# Altium footprint library ICs And Semiconductors SMD.PcbLib: 602 footprints (part 12 of 38)
Each footprint in its own frame and in the unit in brackets; x right, y up, seen from the top. Pads: shape width x height; smd on the part's side, far side on the other; paste and mask are expansions set on the pad; w line width, h text height; cw(c..) or ccw(c..) is an arc to the next point about the centre after c.
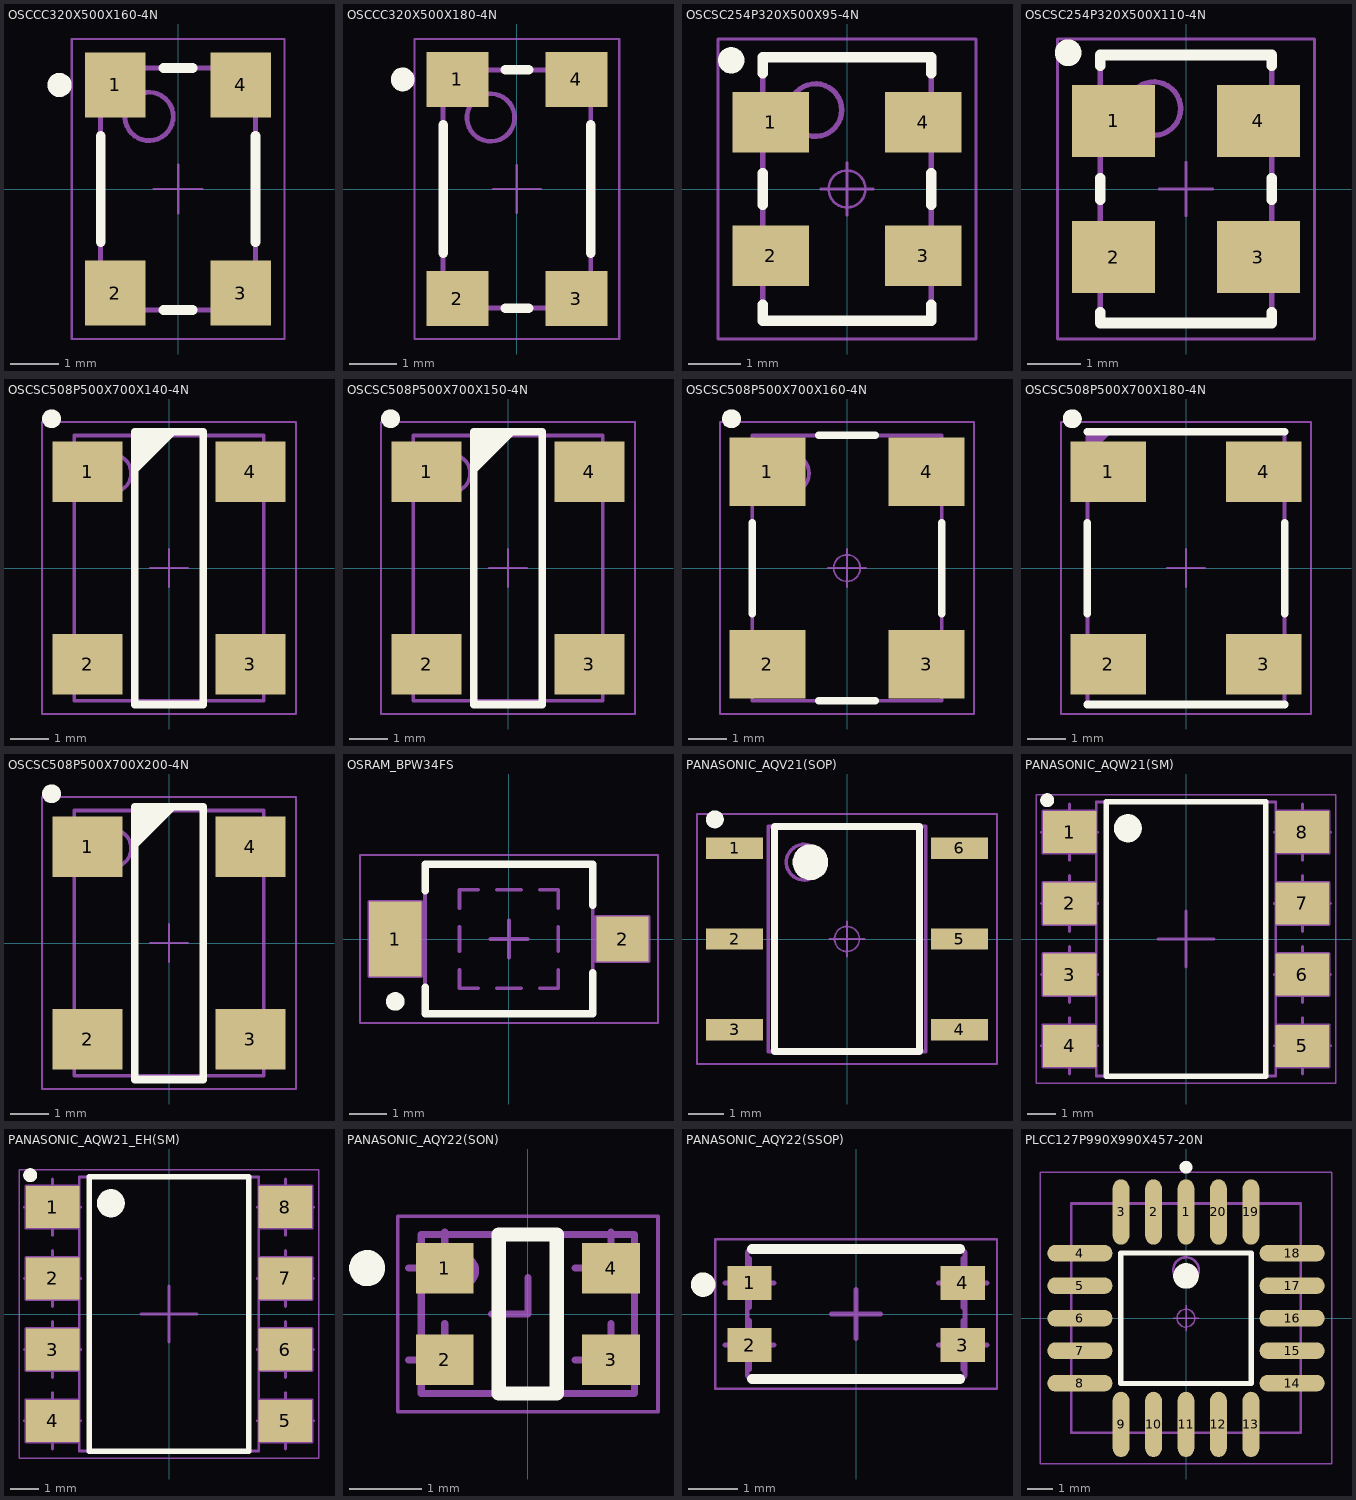
[diagram p11: the footprints below, top view; thin cyan lines are the x and y axes]

## OSCCC320X500X160-4N [mm] "SMD Oscillator, Corner Convave, 4 pins, 5x3.2mm"
height 1.6
pads (4):
  rect 1.25x1.35 smd: 1(-1.3,2.15) 2(-1.3,-2.15) 3(1.3,-2.15) 4(1.3,2.15)
Top Overlay:
  circle w0.25: c-2.45,2.15 r0.125
  lines w0.2: -1.6,-1.1 -1.6,1.1 ; -0.3,-2.5 0.3,-2.5 ; -0.3,2.5 0.3,2.5 ; 1.6,-1.1 1.6,1.1
Mechanical 14:
  circle w0.1: c-0.6,1.5 r0.5
  lines w0.1: -1.6,-2.5 1.6,-2.5 1.6,2.5 -1.6,2.5 -1.6,-2.5
Mechanical 15:
  lines w0.05: -0.5,0 0.5,0 ; 0,-0.5 0,0.5 ; -2.2,-3.1 2.2,-3.1 2.2,3.1 -2.2,3.1 -2.2,-3.1
3D body "OSCCC320X500X160-4N.stp": height 1.6, standoff 0, extent -1.675,-2.575 1.675,2.575

## OSCCC320X500X180-4N [mm] "SMD Oscillator, Corner Convave, 4 pins, 5x3mm"
height 1.8
pads (4):
  rect 1.3x1.15 smd: 1(-1.25,2.3) 2(-1.25,-2.3) 3(1.25,-2.3) 4(1.25,2.3)
Top Overlay:
  circle w0.25: c-2.4,2.3 r0.125
  lines w0.2: -1.55,-1.35 -1.55,1.35 ; -0.25,-2.5 0.25,-2.5 ; -0.25,2.5 0.25,2.5 ; 1.55,-1.35 1.55,1.35
Mechanical 14:
  circle w0.1: c-0.55,1.5 r0.5
  lines w0.1: -1.55,-2.5 1.55,-2.5 1.55,2.5 -1.55,2.5 -1.55,-2.5
Mechanical 15:
  lines w0.05: -0.5,0 0.5,0 ; 0,-0.5 0,0.5 ; -2.15,-3.15 2.15,-3.15 2.15,3.15 -2.15,3.15 -2.15,-3.15
3D body "OSCCC320X500X180-4N.stp": height 1.8, standoff 0, extent -1.7,-2.6 1.7,2.6

## OSCSC254P320X500X95-4N [mm] "Oscillator, side concave; 2.54mm pitch; 4 pin, 3.20mm L X 5.00mm W X 1.10mm H, IPC Medium Density"
height 0.95
pads (4):
  rect 1.45x1.15 smd: 1(-1.45,1.27) 2(-1.45,-1.27) 3(1.45,-1.27) 4(1.45,1.27)
Top Overlay:
  circle w0.25: c-2.2,2.445 r0.125
  lines w0.2: -1.6,-2.2 -1.6,-2.5 1.6,-2.5 1.6,-2.2 ; -1.6,-0.3 -1.6,0.3 ; -1.6,2.2 -1.6,2.5 1.6,2.5 1.6,2.2 ; 1.6,-0.3 1.6,0.3
Mechanical 14:
  circle w0.1: c-0.6,1.5 r0.5
  lines w0.1: -1.6,-2.5 -1.6,2.5 1.6,2.5 1.6,-2.5 -1.6,-2.5
Mechanical 15:
  circle w0.05: c0,0 r0.35
  lines w0.05: -0.5,0 0.5,0 ; 0,-0.5 0,0.5 ; -2.45,-2.85 -2.45,2.85 2.45,2.85 2.45,-2.85 -2.45,-2.85
3D body "OSCSC254P320X500X110-4N.stp": height 1, standoff 0, extent -1.7,-2.6 1.7,2.6

## OSCSC254P320X500X110-4N [mm] "Oscillator, side concave; 2.54mm pitch; 4 pin, 3.20mm L X 5.00mm W X 1.10mm H, IPC Medium Density"
height 1.1
pads (4):
  rect 1.55x1.35 smd: 1(-1.35,1.27) 2(-1.35,-1.27) 3(1.35,-1.27) 4(1.35,1.27)
Top Overlay:
  circle w0.25: c-2.2,2.545 r0.125
  lines w0.2: -1.6,-2.3 -1.6,-2.5 1.6,-2.5 1.6,-2.3 ; -1.6,-0.2 -1.6,0.2 ; -1.6,2.3 -1.6,2.5 1.6,2.5 1.6,2.3 ; 1.6,-0.2 1.6,0.2
Mechanical 14:
  circle w0.1: c-0.6,1.5 r0.5
  lines w0.1: -1.6,-2.5 -1.6,2.5 1.6,2.5 1.6,-2.5 -1.6,-2.5
Mechanical 15:
  lines w0.05: -0.5,0 0.5,0 ; 0,-0.5 0,0.5 ; -2.4,-2.8 -2.4,2.8 2.4,2.8 2.4,-2.8 -2.4,-2.8
3D body "OSCSC254P320X500X110-4N.stp": height 1, standoff 0, extent -1.7,-2.6 1.7,2.6

## OSCSC508P500X700X140-4N [mm] "Oscillator,side concave; 5.08mm pitch; 4 pin,5.00mm L X 7.00mm W X 1.40mm H, IPC Medium Density"
height 1.4
pads (4):
  rect 1.85x1.6 smd: 1(-2.15,2.54) 2(-2.15,-2.54) 3(2.15,-2.54) 4(2.15,2.54)
Top Overlay:
  circle w0.25: c-3.1,3.94 r0.125
  lines w0.2: -0.9,2.6 0.1,3.6 ; -0.9,2.8 -0.1,3.6 ; -0.9,3 -0.3,3.6 ; -0.9,3.2 -0.5,3.6 ; -0.9,3.4 -0.7,3.6 ; -0.9,-3.6 0.9,-3.6 0.9,3.6 -0.9,3.6 -0.9,-3.6
Mechanical 14:
  circle w0.1: c-1.5,2.5 r0.5
  lines w0.1: -2.5,-3.5 2.5,-3.5 2.5,3.5 -2.5,3.5 -2.5,-3.5
Mechanical 15:
  lines w0.05: -0.5,0 0.5,0 ; 0,-0.5 0,0.5 ; -3.35,-3.85 3.35,-3.85 3.35,3.85 -3.35,3.85 -3.35,-3.85
3D body "OSCSC508P500X700X140-4N.stp": height 1.4, standoff 0, extent -2.6,-3.6 2.6,3.6

## OSCSC508P500X700X150-4N [mm] "CFPS-72-73 Case, SMD Oscillator, side convave, 4 pins, 5.00x7.00mm"
height 1.5
pads (4):
  rect 1.85x1.6 smd: 1(-2.15,2.54) 2(-2.15,-2.54) 3(2.15,-2.54) 4(2.15,2.54)
Top Overlay:
  circle w0.25: c-3.1,3.94 r0.125
  lines w0.2: -0.9,2.6 0.1,3.6 ; -0.9,2.8 -0.1,3.6 ; -0.9,3 -0.3,3.6 ; -0.9,3.2 -0.5,3.6 ; -0.9,3.4 -0.7,3.6 ; -0.9,-3.6 -0.9,3.6 0.9,3.6 0.9,-3.6 -0.9,-3.6
Mechanical 14:
  circle w0.1: c-1.5,2.5 r0.5
  lines w0.1: -2.5,-3.5 2.5,-3.5 2.5,3.5 -2.5,3.5 -2.5,-3.5
Mechanical 15:
  lines w0.05: -0.5,0 0.5,0 ; 0,-0.5 0,0.5 ; -3.35,-3.85 3.35,-3.85 3.35,3.85 -3.35,3.85 -3.35,-3.85
3D body "OSCSC508P500X700X150-4N.stp": height 1.5, standoff 0, extent -2.6,-3.6 2.6,3.6

## OSCSC508P500X700X160-4N [mm] "SMD Oscillator, side convave, 4 pins, 5.00x7.00mm"
height 1.6
pads (4):
  rect 2x1.8 smd: 1(-2.1,2.54) 2(-2.1,-2.54) 3(2.1,-2.54) 4(2.1,2.54)
Top Overlay:
  circle w0.25: c-3.05,3.94 r0.125
  lines w0.2: -2.5,-1.2 -2.5,1.2 ; -0.75,-3.5 0.75,-3.5 ; -0.75,3.5 0.75,3.5 ; 2.5,-1.2 2.5,1.2
Mechanical 14:
  circle w0.1: c-1.5,2.5 r0.5
  lines w0.1: -2.5,-3.5 -2.5,3.5 2.5,3.5 2.5,-3.5 -2.5,-3.5
Mechanical 15:
  circle w0.05: c0,0 r0.35
  lines w0.05: -0.5,0 0.5,0 ; 0,-0.5 0,0.5 ; -3.35,-3.85 -3.35,3.85 3.35,3.85 3.35,-3.85 -3.35,-3.85
3D body "OSCSC508P500X700X160-4N.stp": height 1.6, standoff 0, extent -2.6,-3.6 2.6,3.6

## OSCSC508P500X700X180-4N [mm] "SMD Oscillator, side convave, 4 pins, 5.00x7.00mm"
height 1.8
pads (4):
  rect 2x1.6 smd: 1(-2.05,2.54) 2(-2.05,-2.54) 3(2.05,-2.54) 4(2.05,2.54)
Top Overlay:
  circle w0.25: c-3,3.94 r0.125
  lines w0.2: -2.6,-3.6 2.6,-3.6 ; -2.6,-1.2 -2.6,1.2 ; -2.6,3.6 2.6,3.6 ; 2.6,-1.2 2.6,1.2
Mechanical 14:
  lines w0.1: -2.6,3 -2,3.6 ; -2.6,3.1 -2.1,3.6 ; -2.6,3.2 -2.2,3.6 ; -2.6,3.3 -2.3,3.6 ; -2.6,3.4 -2.4,3.6 ; -2.6,3.5 -2.5,3.6 ; -2.6,-3.6 2.6,-3.6 2.6,3.6 -2.6,3.6 -2.6,-3.6
Mechanical 15:
  lines w0.05: -0.5,0 0.5,0 ; 0,-0.5 0,0.5 ; -3.3,-3.85 -3.3,3.85 3.3,3.85 3.3,-3.85 -3.3,-3.85
3D body "OSCSC508P500X700X180-4N.stp": height 1.8, standoff 0, extent -2.6,-3.6 2.6,3.6

## OSCSC508P500X700X200-4N [mm] "CFPT Case, SMD Oscillator, side convave, 4 pins, 5.00x7.00mm"
height 2
pads (4):
  rect 1.85x1.6 smd: 1(-2.15,2.54) 2(-2.15,-2.54) 3(2.15,-2.54) 4(2.15,2.54)
Top Overlay:
  circle w0.25: c-3.1,3.94 r0.125
  lines w0.2: -0.9,2.6 0.1,3.6 ; -0.9,2.8 -0.1,3.6 ; -0.9,3 -0.3,3.6 ; -0.9,3.2 -0.5,3.6 ; -0.9,3.4 -0.7,3.6 ; -0.9,-3.6 0.9,-3.6 0.9,3.6 -0.9,3.6 -0.9,-3.6
Mechanical 14:
  circle w0.1: c-1.5,2.5 r0.5
  lines w0.1: -2.5,-3.5 -2.5,3.5 2.5,3.5 2.5,-3.5 -2.5,-3.5
Mechanical 15:
  lines w0.05: -0.5,0 0.5,0 ; 0,-0.5 0,0.5 ; -3.35,-3.85 -3.35,3.85 3.35,3.85 3.35,-3.85 -3.35,-3.85
3D body "OSCSC508P500X700X200-4N.stp": height 2, standoff 0, extent -2.6,-3.6 2.6,3.6

## OSRAM_BPW34FS [mm] "SMT Silicon PIN Photodiode, Photosensitive Area 2.65 x 2.65 mm, with Daylight Filter"
height 1.2
pads (2):
  rect 1.4x2 smd: 1(-3.05,0)
  rect 1.4x1.2 smd: 2(3.05,0)
Top Overlay:
  circle w0.25: c-3.05,-1.675 r0.125
  lines w0.2: -2.25,-1.3 -2.25,-2 2.25,-2 2.25,-0.9 ; -2.25,1.3 -2.25,2 2.25,2 2.25,0.9
Mechanical 8:
  lines w0.1: -3.55,0 -3.05,0 ; -3.05,-0.5 -3.05,0 ; -3.05,0.5 -3.05,0 ; -2.55,0 -3.05,0 ; -0.5,0 0,0 ; 0,-0.5 0,0 ; 0,0.5 0,0 ; 0.5,0 0,0 ; 2.55,0 3.05,0 ; 3.05,-0.5 3.05,0 ; 3.05,0.5 3.05,0 ; 3.55,0 3.05,0 ; -3.75,-1 -3.75,1 -2.35,1 -2.35,-1 -3.75,-1 ; 2.35,-0.6 2.35,0.6 3.75,0.6 3.75,-0.6 2.35,-0.6
Mechanical 14:
  lines w0.1: -2.25,-0.85 -3.35,-0.85 -3.35,0.85 -2.25,0.85 ; -2.25,-0.45 -2.656,-0.45 -2.656,0.45 -2.25,0.45 ; -1.325,-0.825 -1.325,-1.325 -0.825,-1.325 ; -1.325,-0.325 -1.325,0.325 ; -1.325,0.825 -1.325,1.325 -0.825,1.325 ; -0.325,-1.325 0.325,-1.325 ; -0.325,1.325 0.325,1.325 ; 0.825,-1.325 1.325,-1.325 1.325,-0.825 ; 0.825,1.325 1.325,1.325 1.325,0.825 ; 1.325,-0.325 1.325,0.325 ; 2.25,-0.45 3.35,-0.45 3.35,0.45 2.25,0.45 ; -2.25,-2 2.25,-2 2.25,2 -2.25,2 -2.25,-2
Mechanical 15:
  lines w0.05: -4,-2.25 4,-2.25 4,2.25 -4,2.25 -4,-2.25
3D body "OSRAM_BPW34FS.stp": height 1.2, standoff 0, extent -3.35,-2 3.35,2

## PANASONIC_AQV21(SOP) [mm] "PANASONIC_AQV21(SOP) 2.54mm pitch; 6 pin, 4.40mm W X 6.30mm L X 2.20mm H body"
height 2.2
pads (6):
  rect 1.6x0.6 smd: 1(-3.15,2.54) 2(-3.15,0) 3(-3.15,-2.54) 4(3.15,-2.54) 5(3.15,0) 6(3.15,2.54)
Top Overlay:
  circle w0.5: c-1.025,2.15 r0.25
  circle w0.25: c-3.7,3.35 r0.125
  lines w0.2: -2.025,-3.15 2.025,-3.15 2.025,3.15 -2.025,3.15 -2.025,-3.15
Mechanical 14:
  circle w0.1: c-1.2,2.15 r0.5
  lines w0.1: -2.2,-3.15 2.2,-3.15 2.2,3.15 -2.2,3.15 -2.2,-3.15
Mechanical 15:
  circle w0.05: c0,0 r0.35
  lines w0.05: -0.5,0 0.5,0 ; 0,-0.5 0,0.5 ; -4.2,-3.5 4.2,-3.5 4.2,3.5 -4.2,3.5 -4.2,-3.5
3D body "PANASONIC_AQV21(SOP).stp": height 2.2, standoff 0, extent -3.6,-3.25 3.6,3.25

## PANASONIC_AQW21(SM) [mm] "PANASONIC AQW21, Gull Wing Surface Mount, 8-Leads, Body 9.78mm x 6.4mm, Pitch 2.54mm"
height 3.4
pads (8):
  rect 1.9x1.5 smd: 1(-4.15,3.81) 2(-4.15,1.27) 3(-4.15,-1.27) 4(-4.15,-3.81) 5(4.15,-3.81) 6(4.15,-1.27) 7(4.15,1.27) 8(4.15,3.81)
Top Overlay:
  circle w0.5: c-2.075,3.95 r0.25
  circle w0.25: c-4.95,4.95 r0.125
  lines w0.2: -2.85,-4.89 -2.85,4.89 2.85,4.89 2.85,-4.89 -2.85,-4.89
Mechanical 8:
  lines w0.1: -5.15,-3.81 -4.15,-3.81 ; -5.15,-1.27 -4.15,-1.27 ; -5.15,1.27 -4.15,1.27 ; -5.15,3.81 -4.15,3.81 ; -4.15,-4.81 -4.15,-3.81 ; -4.15,-2.81 -4.15,-3.81 ; -4.15,-2.27 -4.15,-1.27 ; -4.15,-0.27 -4.15,-1.27 ; -4.15,0.27 -4.15,1.27 ; -4.15,2.27 -4.15,1.27 ; -4.15,2.81 -4.15,3.81 ; -4.15,4.81 -4.15,3.81 ; -3.15,-3.81 -4.15,-3.81 ; -3.15,-1.27 -4.15,-1.27 ; -3.15,1.27 -4.15,1.27 ; -3.15,3.81 -4.15,3.81 ; -1,0 0,0 ; 0,-1 0,0 ; 0,1 0,0 ; 1,0 0,0 ; 3.15,-3.81 4.15,-3.81 ; 3.15,-1.27 4.15,-1.27 ; 3.15,1.27 4.15,1.27 ; 3.15,3.81 4.15,3.81 ; 4.15,-4.81 4.15,-3.81 ; 4.15,-2.81 4.15,-3.81 ; 4.15,-2.27 4.15,-1.27 ; 4.15,-0.27 4.15,-1.27 ; 4.15,0.27 4.15,1.27 ; 4.15,2.27 4.15,1.27 ; 4.15,2.81 4.15,3.81 ; 4.15,4.81 4.15,3.81 ; 5.15,-3.81 4.15,-3.81 ; 5.15,-1.27 4.15,-1.27 ; 5.15,1.27 4.15,1.27 ; 5.15,3.81 4.15,3.81 ; -5.1,-4.56 -5.1,-3.06 -3.2,-3.06 -3.2,-4.56 -5.1,-4.56 ; -5.1,-2.02 -5.1,-0.52 -3.2,-0.52 -3.2,-2.02 -5.1,-2.02 ; -5.1,0.52 -5.1,2.02 -3.2,2.02 -3.2,0.52 -5.1,0.52 ; -5.1,3.06 -5.1,4.56 -3.2,4.56 -3.2,3.06 -5.1,3.06 ; 3.2,-4.56 3.2,-3.06 5.1,-3.06 5.1,-4.56 3.2,-4.56 ; 3.2,-2.02 3.2,-0.52 5.1,-0.52 5.1,-2.02 3.2,-2.02 ; 3.2,0.52 3.2,2.02 5.1,2.02 5.1,0.52 3.2,0.52 ; 3.2,3.06 3.2,4.56 5.1,4.56 5.1,3.06 3.2,3.06
Mechanical 14:
  lines w0.1: -3.2,-4.89 -3.2,4.89 3.2,4.89 3.2,-4.89 -3.2,-4.89
Mechanical 15:
  lines w0.05: -5.35,-5.14 5.35,-5.14 5.35,5.14 -5.35,5.14 -5.35,-5.14
3D body "PANASONIC_AQW21(DIP).stp": height 3.4, standoff 0, extent -4.81,-4.89 4.81,4.89

## PANASONIC_AQW21_EH(SM) [mm] "PANASONIC AQW21 Gull Wing Surface Mount, 8-Leads, Body 9.86mm x 6.4mm, Pitch 2.54mm"
height 2.95
pads (8):
  rect 1.9x1.5 smd: 1(-4.15,3.81) 2(-4.15,1.27) 3(-4.15,-1.27) 4(-4.15,-3.81) 5(4.15,-3.81) 6(4.15,-1.27) 7(4.15,1.27) 8(4.15,3.81)
Top Overlay:
  circle w0.5: c-2.075,3.95 r0.25
  circle w0.25: c-4.95,4.95 r0.125
  lines w0.2: -2.85,-4.89 -2.85,4.89 2.85,4.89 2.85,-4.89 -2.85,-4.89
Mechanical 8:
  lines w0.1: -5.15,-3.81 -4.15,-3.81 ; -5.15,-1.27 -4.15,-1.27 ; -5.15,1.27 -4.15,1.27 ; -5.15,3.81 -4.15,3.81 ; -4.15,-4.81 -4.15,-3.81 ; -4.15,-2.81 -4.15,-3.81 ; -4.15,-2.27 -4.15,-1.27 ; -4.15,-0.27 -4.15,-1.27 ; -4.15,0.27 -4.15,1.27 ; -4.15,2.27 -4.15,1.27 ; -4.15,2.81 -4.15,3.81 ; -4.15,4.81 -4.15,3.81 ; -3.15,-3.81 -4.15,-3.81 ; -3.15,-1.27 -4.15,-1.27 ; -3.15,1.27 -4.15,1.27 ; -3.15,3.81 -4.15,3.81 ; -1,0 0,0 ; 0,-1 0,0 ; 0,1 0,0 ; 1,0 0,0 ; 3.15,-3.81 4.15,-3.81 ; 3.15,-1.27 4.15,-1.27 ; 3.15,1.27 4.15,1.27 ; 3.15,3.81 4.15,3.81 ; 4.15,-4.81 4.15,-3.81 ; 4.15,-2.81 4.15,-3.81 ; 4.15,-2.27 4.15,-1.27 ; 4.15,-0.27 4.15,-1.27 ; 4.15,0.27 4.15,1.27 ; 4.15,2.27 4.15,1.27 ; 4.15,2.81 4.15,3.81 ; 4.15,4.81 4.15,3.81 ; 5.15,-3.81 4.15,-3.81 ; 5.15,-1.27 4.15,-1.27 ; 5.15,1.27 4.15,1.27 ; 5.15,3.81 4.15,3.81 ; -5.1,-4.56 -5.1,-3.06 -3.2,-3.06 -3.2,-4.56 -5.1,-4.56 ; -5.1,-2.02 -5.1,-0.52 -3.2,-0.52 -3.2,-2.02 -5.1,-2.02 ; -5.1,0.52 -5.1,2.02 -3.2,2.02 -3.2,0.52 -5.1,0.52 ; -5.1,3.06 -5.1,4.56 -3.2,4.56 -3.2,3.06 -5.1,3.06 ; 3.2,-4.56 3.2,-3.06 5.1,-3.06 5.1,-4.56 3.2,-4.56 ; 3.2,-2.02 3.2,-0.52 5.1,-0.52 5.1,-2.02 3.2,-2.02 ; 3.2,0.52 3.2,2.02 5.1,2.02 5.1,0.52 3.2,0.52 ; 3.2,3.06 3.2,4.56 5.1,4.56 5.1,3.06 3.2,3.06
Mechanical 14:
  lines w0.1: -3.2,-4.89 -3.2,4.89 3.2,4.89 3.2,-4.89 -3.2,-4.89
Mechanical 15:
  lines w0.05: -5.35,-5.14 5.35,-5.14 5.35,5.14 -5.35,5.14 -5.35,-5.14
3D body "PANASONIC_AQW21_EH(SM).stp": height 2.95, standoff 0, extent -4.81,-4.89 4.81,4.89

## PANASONIC_AQY22(SON) [mm] "PANASONIC Serie AQY22(SON)  Small Outline No Lead, 4 pins, 2.2x2.95mm"
height 1.4
pads (4):
  rect 0.8x0.7 smd: 1(-1.15,0.635) 2(-1.15,-0.635) 3(1.15,-0.635) 4(1.15,0.635)
Top Overlay:
  circle w0.25: c-2.225,0.635 r0.125
  lines w0.2: -0.4,-1.1 -0.4,1.1 0.4,1.1 0.4,-1.1 -0.4,-1.1
Mechanical 8:
  lines w0.1: -1.65,-0.635 -1.15,-0.635 -1.15,-0.135 ; -1.65,0.635 -1.15,0.635 -1.15,1.135 ; -0.5,0 0,0 0,0.5 ; 0.65,-0.635 1.15,-0.635 1.15,-0.135 ; 0.65,0.635 1.15,0.635 1.15,1.135
Mechanical 14:
  circle w0.1: c-0.925,0.6 r0.2
  lines w0.1: -1.475,-1.1 -1.475,1.1 1.475,1.1 1.475,-1.1 -1.475,-1.1
Mechanical 15:
  lines w0.05: -1.8,-1.35 -1.8,1.35 1.8,1.35 1.8,-1.35 -1.8,-1.35
3D body "PANASONIC_AQY22(SON).stp": height 1.4, standoff 0, extent -1.475,-1.1 1.475,1.1

## PANASONIC_AQY22(SSOP) [mm] "PANASONIC Serie AQY22(SSOP) Flat Leads SSOP  4 pins, 4.45x2.65mm"
height 1.8
pads (4):
  rect 0.9x0.7 smd: 1(-2.175,0.635) 2(-2.175,-0.635) 3(2.175,-0.635) 4(2.175,0.635)
Top Overlay:
  circle w0.25: c-3.125,0.6 r0.125
  lines w0.2: -2.125,-1.325 2.125,-1.325 ; -2.125,1.325 2.125,1.325
Mechanical 8:
  lines w0.1: -2.675,-0.635 -2.175,-0.635 ; -2.675,0.635 -2.175,0.635 ; -2.175,-1.135 -2.175,-0.635 ; -2.175,-0.135 -2.175,-0.635 ; -2.175,0.135 -2.175,0.635 ; -2.175,1.135 -2.175,0.635 ; -1.675,-0.635 -2.175,-0.635 ; -1.675,0.635 -2.175,0.635 ; -0.5,0 0,0 ; 0,-0.5 0,0 ; 0,0.5 0,0 ; 0.5,0 0,0 ; 1.675,-0.635 2.175,-0.635 ; 1.675,0.635 2.175,0.635 ; 2.175,-1.135 2.175,-0.635 ; 2.175,-0.135 2.175,-0.635 ; 2.175,0.135 2.175,0.635 ; 2.175,1.135 2.175,0.635 ; 2.675,-0.635 2.175,-0.635 ; 2.675,0.635 2.175,0.635
Mechanical 14:
  lines w0.1: -2.225,-0.835 -2.425,-0.835 -2.425,-0.435 -2.225,-0.435 ; -2.225,0.435 -2.425,0.435 -2.425,0.835 -2.225,0.835 ; 2.225,-0.835 2.425,-0.835 2.425,-0.435 2.225,-0.435 ; 2.225,0.435 2.425,0.435 2.425,0.835 2.225,0.835 ; -2.225,-1.225 ccw(c-2.125,-1.225) -2.125,-1.325 2.125,-1.325 ccw(c2.125,-1.225) 2.225,-1.225 2.225,1.225 ccw(c2.125,1.225) 2.125,1.325 -2.125,1.325 ccw(c-2.125,1.225) -2.225,1.225 -2.225,-1.225
Mechanical 15:
  lines w0.05: -2.875,-1.525 -2.875,1.525 2.875,1.525 2.875,-1.525 -2.875,-1.525
3D body "PANASONIC_AQY22(SSOP).stp": height 1.8, standoff 0, extent -2.425,-1.325 2.425,1.325

## PLCC127P990X990X457-20N [mm] "PLCC, 1.27mm Pitch, Square; 20 Pin, 8.97mm L X 8.97mm W X 4.57mm H Body, IPC Medium Density"
height 4.57
pads (20):
  oval 0.65x2.55 smd: 1(0,4.15) 2(-1.27,4.15) 3(-2.54,4.15) 9(-2.54,-4.15) 10(-1.27,-4.15) 11(0,-4.15) 12(1.27,-4.15) 13(2.54,-4.15) 19(2.54,4.15) 20(1.27,4.15)
  oval 2.55x0.65 smd: 4(-4.15,2.54) 5(-4.15,1.27) 6(-4.15,0) 7(-4.15,-1.27) 8(-4.15,-2.54) 14(4.15,-2.54) 15(4.15,-1.27) 16(4.15,0) 17(4.15,1.27) 18(4.15,2.54)
Top Overlay:
  circle w0.5: c0,1.65 r0.25
  circle w0.25: c0,5.9 r0.125
  lines w0.2: -2.55,-2.55 -2.55,2.55 2.55,2.55 2.55,-2.55 -2.55,-2.55
Mechanical 14:
  circle w0.1: c0,1.875 r0.5
  lines w0.1: -4.482,-4.482 -4.482,4.482 4.482,4.482 4.482,-4.482 -4.482,-4.482
Mechanical 15:
  circle w0.05: c0,0 r0.35
  lines w0.05: -0.5,0 0.5,0 ; 0,-0.5 0,0.5 ; -5.7,-5.7 -5.7,5.7 5.7,5.7 5.7,-5.7 -5.7,-5.7
3D body "PLCC127P990X990X457-20N.stp": height 4.57, standoff 0, extent -4.95,-4.944 4.95,4.944